# Altium footprint library 全库.PcbLib: 967 footprints (part 5 of 61) (continued)
## Antenna [mm] (continued)
14.4,5.131 ; 11.7,5.133 12.2,5.133 ; 11.7,5.157 14.4,5.157 ; 11.7,5.158 12.2,5.158 ; 11.7,5.182 14.4,5.182 ; 11.7,5.184 12.2,5.184 ; 11.7,5.207 14.4,5.207 ; 11.7,5.209 12.2,5.209 ; 11.7,5.233 14.4,5.233 ; 11.7,5.234 12.2,5.234 ; 11.7,5.258 14.4,5.258 ; 11.7,5.26 12.2,5.26 ; 11.7,5.284 14.4,5.284 ; 11.7,5.285 12.2,5.285 ; 11.7,5.309 14.4,5.309 ; 11.7,5.311 12.2,5.311 ; 11.7,5.334 14.4,5.334 ; 11.7,5.336 12.2,5.336 ; 11.7,5.36 14.4,5.36 ; 11.7,5.361 12.2,5.361 ; 11.7,5.385 14.4,5.385 ; 11.7,5.387 12.2,5.387 ; 13.9,0.963 14.4,0.963 ; 13.9,0.988 14.4,0.988 ; 13.9,1.013 14.4,1.013 ; 13.9,1.039 14.4,1.039 ; 13.9,1.064 14.4,1.064 ; 13.9,1.09 14.4,1.09 ; 13.9,1.115 14.4,1.115 ; 13.9,1.14 14.4,1.14 ; 13.9,1.166 14.4,1.166 ; 13.9,1.191 14.4,1.191 ; 13.9,1.217 14.4,1.217 ; 13.9,1.242 14.4,1.242 ; 13.9,1.267 14.4,1.267 ; 13.9,1.293 14.4,1.293 ; 13.9,1.318 14.4,1.318 ; 13.9,1.344 14.4,1.344 ; 13.9,1.369 14.4,1.369 ; 13.9,1.394 14.4,1.394 ; 13.9,1.42 14.4,1.42 ; 13.9,1.445 14.4,1.445 ; 13.9,1.471 14.4,1.471 ; 13.9,1.496 14.4,1.496 ; 13.9,1.521 14.4,1.521 ; 13.9,1.547 14.4,1.547 ; 13.9,1.572 14.4,1.572 ; 13.9,1.598 14.4,1.598 ; 13.9,1.623 14.4,1.623 ; 13.9,1.648 14.4,1.648 ; 13.9,1.674 14.4,1.674 ; 13.9,1.699 14.4,1.699 ; 13.9,1.725 14.4,1.725 ; 13.9,1.75 14.4,1.75 ; 13.9,1.775 14.4,1.775 ; 13.9,1.801 14.4,1.801 ; 13.9,1.826 14.4,1.826 ; 13.9,1.852 14.4,1.852 ; 13.9,1.877 14.4,1.877 ; 13.9,1.902 14.4,1.902 ; 13.9,1.928 14.4,1.928 ; 13.9,1.953 14.4,1.953 ; 13.9,1.979 14.4,1.979 ; 13.9,2.004 14.4,2.004 ; 13.9,2.029 14.4,2.029 ; 13.9,2.055 14.4,2.055 ; 13.9,2.08 14.4,2.08 ; 13.9,2.106 14.4,2.106 ; 13.9,2.131 14.4,2.131 ; 13.9,2.156 14.4,2.156 ; 13.9,2.182 14.4,2.182 ; 13.9,2.207 14.4,2.207 ; 13.9,2.233 14.4,2.233 ; 13.9,2.258 14.4,2.258 ; 13.9,2.283 14.4,2.283 ; 13.9,2.309 14.4,2.309 ; 13.9,2.334 14.4,2.334 ; 13.9,2.36 14.4,2.36 ; 13.9,2.385 14.4,2.385 ; 13.9,2.41 14.4,2.41 ; 13.9,2.436 14.4,2.436 ; 13.9,2.461 14.4,2.461 ; 13.9,2.487 14.4,2.487 ; 13.9,2.512 14.4,2.512 ; 13.9,2.537 14.4,2.537 ; 13.9,2.563 14.4,2.563 ; 13.9,2.588 14.4,2.588 ; 13.9,2.614 14.4,2.614 ; 13.9,2.639 14.4,2.639 ; 13.9,2.664 14.4,2.664 ; 13.9,2.69 14.4,2.69 ; 13.9,2.715 14.4,2.715 ; 13.9,2.741 14.4,2.741 ; 13.9,2.766 14.4,2.766 ; 13.9,2.791 14.4,2.791 ; 13.9,2.817 14.4,2.817 ; 13.9,2.842 14.4,2.842 ; 13.9,2.868 14.4,2.868 ; 13.9,2.893 14.4,2.893 ; 13.9,2.918 14.4,2.918 ; 13.9,2.944 14.4,2.944 ; 13.9,2.969 14.4,2.969 ; 13.9,2.995 14.4,2.995 ; 13.9,3.02 14.4,3.02 ; 13.9,3.045 14.4,3.045 ; 13.9,3.071 14.4,3.071 ; 13.9,3.096 14.4,3.096 ; 13.9,3.122 14.4,3.122 ; 13.9,3.147 14.4,3.147 ; 13.9,3.172 14.4,3.172 ; 13.9,3.198 14.4,3.198 ; 13.9,3.223 14.4,3.223 ; 13.9,3.249 14.4,3.249 ; 13.9,3.274 14.4,3.274 ; 13.9,3.299 14.4,3.299 ; 13.9,3.325 14.4,3.325 ; 13.9,3.35 14.4,3.35 ; 13.9,3.376 14.4,3.376 ; 13.9,3.401 14.4,3.401 ; 13.9,3.426 14.4,3.426 ; 13.9,3.452 14.4,3.452 ; 13.9,3.477 14.4,3.477 ; 13.9,3.503 14.4,3.503 ; 13.9,3.528 14.4,3.528 ; 13.9,3.553 14.4,3.553 ; 13.9,3.579 14.4,3.579 ; 13.9,3.604 14.4,3.604 ; 13.9,3.63 14.4,3.63 ; 13.9,3.655 14.4,3.655 ; 13.9,3.68 14.4,3.68 ; 13.9,3.706 14.4,3.706 ; 13.9,3.731 14.4,3.731 ; 13.9,3.757 14.4,3.757 ; 13.9,3.782 14.4,3.782 ; 13.9,3.807 14.4,3.807 ; 13.9,3.833 14.4,3.833 ; 13.9,3.858 14.4,3.858 ; 13.9,3.884 14.4,3.884 ; 13.9,3.909 14.4,3.909 ; 13.9,3.934 14.4,3.934 ; 13.9,3.96 14.4,3.96 ; 13.9,3.985 14.4,3.985 ; 13.9,4.011 14.4,4.011 ; 13.9,4.036 14.4,4.036 ; 13.9,4.061 14.4,4.061 ; 13.9,4.087 14.4,4.087 ; 13.9,4.112 14.4,4.112 ; 13.9,4.138 14.4,4.138 ; 13.9,4.163 14.4,4.163 ; 13.9,4.188 14.4,4.188 ; 13.9,4.214 14.4,4.214 ; 13.9,4.239 14.4,4.239 ; 13.9,4.265 14.4,4.265 ; 13.9,4.29 14.4,4.29 ; 13.9,4.315 14.4,4.315 ; 13.9,4.341 14.4,4.341 ; 13.9,4.366 14.4,4.366 ; 13.9,4.392 14.4,4.392 ; 13.9,4.417 14.4,4.417 ; 13.9,4.442 14.4,4.442 ; 13.9,4.468 14.4,4.468 ; 13.9,4.493 14.4,4.493 ; 13.9,4.519 14.4,4.519 ; 13.9,4.544 14.4,4.544 ; 13.9,4.569 14.4,4.569 ; 13.9,4.595 14.4,4.595 ; 13.9,4.62 14.4,4.62 ; 13.9,4.646 14.4,4.646 ; 13.9,4.671 14.4,4.671 ; 13.9,4.696 14.4,4.696 ; 13.9,4.722 14.4,4.722 ; 13.9,4.747 14.4,4.747 ; 13.9,4.773 14.4,4.773 ; 13.9,4.798 14.4,4.798 ; 13.9,4.823 14.4,4.823 ; 13.9,4.849 14.4,4.849 ; 13.9,4.874 14.4,4.874 ; 13.9,4.9 14.4,4.9 ; 13.9,4.925 14.4,4.925 ; 13.9,4.95 14.4,4.95 ; 13.9,4.976 14.4,4.976 ; 13.9,5.001 14.4,5.001 ; 13.9,5.027 14.4,5.027 ; 13.9,5.052 14.4,5.052 ; 13.9,5.077 14.4,5.077 ; 13.9,5.103 14.4,5.103 ; 13.9,5.128 14.4,5.128 ; 13.9,5.154 14.4,5.154 ; 13.9,5.179 14.4,5.179 ; 13.9,5.204 14.4,5.204 ; 13.9,5.23 14.4,5.23 ; 13.9,5.255 14.4,5.255 ; 13.9,5.281 14.4,5.281 ; 13.9,5.306 14.4,5.306 ; 13.9,5.331 14.4,5.331 ; 13.9,5.357 14.4,5.357 ; 13.9,5.382 14.4,5.382 ; 0,4.89 0,5.39 ; 0,4.89 5,4.89 5,5.39 ; 0,5.39 0,0 0.9,0 0.9,5.39 0,5.39 ; 0,5.39 5,5.39 ; 4.5,2.25 4.5,2.75 7.5,2.75 7.5,2.25 ; 4.5,2.25 7.5,2.25 ; 4.5,2.25 4.5,5.39 5,5.39 ; 4.5,2.25 5,2.25 5,5.39 ; 7,5.39 7,4.89 9.7,4.89 9.7,5.39 ; 7,5.39 9.7,5.39 ; 7,5.39 7.5,5.39 7.5,2.25 ; 7,5.39 7,2.25 7.5,2.25 ; 9.2,2.25 9.7,2.25 9.7,5.39 ; 9.2,2.25 9.2,5.39 9.7,5.39 ; 9.2,2.25 9.2,2.75 12.2,2.75 12.2,2.25 ; 9.2,2.25 12.2,2.25 ; 11.7,5.39 12.2,5.39 12.2,2.25 ; 11.7,5.39 11.7,2.25 12.2,2.25 ; 11.7,5.39 11.7,4.89 14.4,4.89 14.4,5.39 ; 11.7,5.39 14.4,5.39 ; 14.4,5.39 14.4,0.95 13.9,0.95 13.9,5.39 14.4,5.39 ; 2.3,0 2.3,5.39 2.8,5.39 2.8,0 2.3,0
Keep-Out Layer:
  lines w0.01: -0.5,0.5 0,0.5 ; 5.3,5.69 14.7,5.69
Mechanical 1:
  lines w0.01: -0.5,0.5 -0.5,5.69 14.7,5.69 14.7,0.5 -0.5,0.5

## BGA-14 [mm]
pads (14):
  round 0.3 smd mask+0.051: A1(-0.75,-0.75) A2(-0.75,-0.25) A3(-0.75,0.25) A4(-0.75,0.75) B1(-0.25,-0.75) B3(-0.25,0.25) B4(-0.25,0.75) C1(0.25,-0.75) C2(0.25,-0.25) C3(0.25,0.25) C4(0.25,0.75) D1(0.75,-0.75) D2(0.75,-0.25) D4(0.75,0.75)
Top Overlay:
  circle w0.25: c-1.05,-1.7 r0.12
  lines w0.2: -1.175,-0.975 -0.975,-1.2 ; -1.2,-1.2 -1.2,1.2 1.2,1.2 1.2,-1.2 -1.2,-1.2
Mechanical 13:
  lines w0.1: -1,-1 -1,1 1,1 1,-1 -1,-1

## BGA-84_7.5x12.5mm [mm]
pads (84):
  round 0.41 smd mask+0.051: A1(-5.6,-3.2) A2(-5.6,-2.4) A3(-5.6,-1.6) A7(-5.6,1.6) A8(-5.6,2.4) A9(-5.6,3.2) B1(-4.8,-3.2) B2(-4.8,-2.4) B3(-4.8,-1.6) B7(-4.8,1.6) B8(-4.8,2.4) B9(-4.8,3.2) C1(-4,-3.2) C2(-4,-2.4) C3(-4,-1.6) C7(-4,1.6) C8(-4,2.4) C9(-4,3.2) D1(-3.2,-3.2) D2(-3.2,-2.4) D3(-3.2,-1.6) D7(-3.2,1.6) D8(-3.2,2.4) D9(-3.2,3.2) E1(-2.4,-3.2) E2(-2.4,-2.4) E3(-2.4,-1.6) E7(-2.4,1.6) E8(-2.4,2.4) E9(-2.4,3.2) F1(-1.6,-3.2) F2(-1.6,-2.4) F3(-1.6,-1.6) F7(-1.6,1.6) F8(-1.6,2.4) F9(-1.6,3.2) G1(-0.8,-3.2) G2(-0.8,-2.4) G3(-0.8,-1.6) G7(-0.8,1.6) G8(-0.8,2.4) G9(-0.8,3.2) H1(0,-3.2) H2(0,-2.4) H3(0,-1.6) H7(0,1.6) H8(0,2.4) H9(0,3.2) J1(0.8,-3.2) J2(0.8,-2.4) J3(0.8,-1.6) J7(0.8,1.6) J8(0.8,2.4) J9(0.8,3.2) K2(1.6,-2.4) K3(1.6,-1.6) K7(1.6,1.6) K8(1.6,2.4) K9(1.6,3.2) L1(2.4,-3.2) L2(2.4,-2.4) L3(2.4,-1.6) L7(2.4,1.6) L8(2.4,2.4) M2(3.2,-2.4) M3(3.2,-1.6) M7(3.2,1.6) M8(3.2,2.4) M9(3.2,3.2) N1(4,-3.2) N2(4,-2.4) N3(4,-1.6) N7(4,1.6) N8(4,2.4) P2(4.8,-2.4) P3(4.8,-1.6) P7(4.8,1.6) P8(4.8,2.4) P9(4.8,3.2) R1(5.6,-3.2) R2(5.6,-2.4) R3(5.6,-1.6) R7(5.6,1.6) R8(5.6,2.4)
Top Overlay:
  circle w0.4: c-5.9,-4.5 r0.2
  region: -6.197,-3.697 -5.7,-3.697 -5.999,-3.399 -6.197,-3.2
  lines w0.2: -6.2,-3.7 6.2,-3.7 6.2,3.7 -6.2,3.7 -6.2,-3.7
Mechanical 13:
  lines w0.1: -6.3,-3.8 -6.3,3.8 6.3,3.8 6.3,-3.8 -6.3,-3.8

## BGA-121 [mm]
pads (121):
  round 0.4 smd mask+0.051: A1(-4,-4) A2(-4,-3.2) A3(-4,-2.4) A4(-4,-1.6) A5(-4,-0.8) A6(-4,0) A7(-4,0.8) A8(-4,1.6) A9(-4,2.4) A10(-4,3.2) A11(-4,4) B1(-3.2,-4) B2(-3.2,-3.2) B3(-3.2,-2.4) B4(-3.2,-1.6) B5(-3.2,-0.8) B6(-3.2,0) B7(-3.2,0.8) B8(-3.2,1.6) B9(-3.2,2.4) B10(-3.2,3.2) B11(-3.2,4) C1(-2.4,-4) C2(-2.4,-3.2) C3(-2.4,-2.4) C4(-2.4,-1.6) C5(-2.4,-0.8) C6(-2.4,0) C7(-2.4,0.8) C8(-2.4,1.6) C9(-2.4,2.4) C10(-2.4,3.2) C11(-2.4,4) D1(-1.6,-4) D2(-1.6,-3.2) D3(-1.6,-2.4) D4(-1.6,-1.6) D5(-1.6,-0.8) D6(-1.6,0) D7(-1.6,0.8) D8(-1.6,1.6) D9(-1.6,2.4) D10(-1.6,3.2) D11(-1.6,4) E1(-0.8,-4) E2(-0.8,-3.2) E3(-0.8,-2.4) E4(-0.8,-1.6) E5(-0.8,-0.8) E6(-0.8,0) E7(-0.8,0.8) E8(-0.8,1.6) E9(-0.8,2.4) E10(-0.8,3.2) E11(-0.8,4) F1(0,-4) F2(0,-3.2) F3(0,-2.4) F4(0,-1.6) F5(0,-0.8) F6(0,0) F7(0,0.8) F8(0,1.6) F9(0,2.4) F10(0,3.2) F11(0,4) G1(0.8,-4) G2(0.8,-3.2) G3(0.8,-2.4) G4(0.8,-1.6) G5(0.8,-0.8) G6(0.8,0) G7(0.8,0.8) G8(0.8,1.6) G9(0.8,2.4) G10(0.8,3.2) G11(0.8,4) H1(1.6,-4) H2(1.6,-3.2) H3(1.6,-2.4) H4(1.6,-1.6) H5(1.6,-0.8) H6(1.6,0) H7(1.6,0.8) H8(1.6,1.6) H9(1.6,2.4) H10(1.6,3.2) H11(1.6,4) J1(2.4,-4) J2(2.4,-3.2) J3(2.4,-2.4) J4(2.4,-1.6) J5(2.4,-0.8) J6(2.4,0) J7(2.4,0.8) J8(2.4,1.6) J9(2.4,2.4) J10(2.4,3.2) J11(2.4,4) K1(3.2,-4) K2(3.2,-3.2) K3(3.2,-2.4) K4(3.2,-1.6) K5(3.2,-0.8) K6(3.2,0) K7(3.2,0.8) K8(3.2,1.6) K9(3.2,2.4) K10(3.2,3.2) K11(3.2,4) L1(4,-4) L2(4,-3.2) L3(4,-2.4) L4(4,-1.6) L5(4,-0.8) L6(4,0) L7(4,0.8) L8(4,1.6) L9(4,2.4) L10(4,3.2) L11(4,4)
Top Overlay:
  circle w0.4: c-4.6,-5.7 r0.2
  region: -4.868,-4.863 -3.937,-4.863 -4.863,-3.937 -4.868,-3.937
  lines w0.254: -4.9,-4.9 4.9,-4.9 4.9,4.9 -4.9,4.9 -4.9,-4.9
Mechanical 13:
  lines w0.1: -5,-5 -5,5 5,5 5,-5 -5,-5

## BGA-143 [mm]
pads (143):
  round 0.3 smd mask+0.051: A1(-2.75,-2.75) A2(-2.75,-2.25) A3(-2.75,-1.75) A4(-2.75,-1.25) A5(-2.75,-0.75) A6(-2.75,-0.25) A7(-2.75,0.25) A8(-2.75,0.75) A9(-2.75,1.25) A10(-2.75,1.75) A11(-2.75,2.25) A12(-2.75,2.75) B1(-2.25,-2.75) B2(-2.25,-2.25) B3(-2.25,-1.75) B4(-2.25,-1.25) B5(-2.25,-0.75) B6(-2.25,-0.25) B7(-2.25,0.25) B8(-2.25,0.75) B9(-2.25,1.25) B10(-2.25,1.75) B11(-2.25,2.25) B12(-2.25,2.75) C1(-1.75,-2.75) C2(-1.75,-2.25) C3(-1.75,-1.75) C4(-1.75,-1.25) C5(-1.75,-0.75) C6(-1.75,-0.25) C7(-1.75,0.25) C8(-1.75,0.75) C9(-1.75,1.25) C10(-1.75,1.75) C11(-1.75,2.25) C12(-1.75,2.75) D1(-1.25,-2.75) D2(-1.25,-2.25) D3(-1.25,-1.75) D4(-1.25,-1.25) D5(-1.25,-0.75) D6(-1.25,-0.25) D7(-1.25,0.25) D8(-1.25,0.75) D9(-1.25,1.25) D10(-1.25,1.75) D11(-1.25,2.25) D12(-1.25,2.75) E1(-0.75,-2.75) E2(-0.75,-2.25) E3(-0.75,-1.75) E4(-0.75,-1.25) E5(-0.75,-0.75) E6(-0.75,-0.25) E7(-0.75,0.25) E8(-0.75,0.75) E9(-0.75,1.25) E10(-0.75,1.75) E11(-0.75,2.25) E12(-0.75,2.75) F1(-0.25,-2.75) F2(-0.25,-2.25) F3(-0.25,-1.75) F4(-0.25,-1.25) F5(-0.25,-0.75) F7(-0.25,0.25) F8(-0.25,0.75) F9(-0.25,1.25) F10(-0.25,1.75) F11(-0.25,2.25) F12(-0.25,2.75) G1(0.25,-2.75) G2(0.25,-2.25) G3(0.25,-1.75) G4(0.25,-1.25) G5(0.25,-0.75) G6(0.25,-0.25) G7(0.25,0.25) G8(0.25,0.75) G9(0.25,1.25) G10(0.25,1.75) G11(0.25,2.25) G12(0.25,2.75) H1(0.75,-2.75) H2(0.75,-2.25) H3(0.75,-1.75) H4(0.75,-1.25) H5(0.75,-0.75) H6(0.75,-0.25) H7(0.75,0.25) H8(0.75,0.75) H9(0.75,1.25) H10(0.75,1.75) H11(0.75,2.25) H12(0.75,2.75) J1(1.25,-2.75) J2(1.25,-2.25) J3(1.25,-1.75) J4(1.25,-1.25) J5(1.25,-0.75) J6(1.25,-0.25) J7(1.25,0.25) J8(1.25,0.75) J9(1.25,1.25) J10(1.25,1.75) J11(1.25,2.25) J12(1.25,2.75) K1(1.75,-2.75) K2(1.75,-2.25) K3(1.75,-1.75) K4(1.75,-1.25) K5(1.75,-0.75) K6(1.75,-0.25) K7(1.75,0.25) K8(1.75,0.75) K9(1.75,1.25) K10(1.75,1.75) K11(1.75,2.25) K12(1.75,2.75) L1(2.25,-2.75) L2(2.25,-2.25) L3(2.25,-1.75) L4(2.25,-1.25) L5(2.25,-0.75) L6(2.25,-0.25) L7(2.25,0.25) L8(2.25,0.75) L9(2.25,1.25) L10(2.25,1.75) L11(2.25,2.25) L12(2.25,2.75) M1(2.75,-2.75) M2(2.75,-2.25) M3(2.75,-1.75) M4(2.75,-1.25) M5(2.75,-0.75) M6(2.75,-0.25) M7(2.75,0.25) M8(2.75,0.75) M9(2.75,1.25) M10(2.75,1.75) M11(2.75,2.25) M12(2.75,2.75)
Top Overlay:
  circle w0.3: c-3.2,-4 r0.15
  region: -3.45,-3.45 -2.55,-3.45 -2.75,-3.25 -3.45,-2.55
  lines w0.2: -3.4,-3.4 3.4,-3.4 3.4,3.4 -3.4,3.4 -3.4,-3.4
Mechanical 13:
  lines w0.1: -3.5,-3.5 -3.5,3.5 3.5,3.5 3.5,-3.5 -3.5,-3.5

## BNC_COAXIAL [mm] "Connector; BNC Elbow"
pads (4):
  rect 1.5x1.5 hole 0.9: 1(0,0)
  round 3.3 hole 2: 2(-5.1,-5.1) 2(5.1,-5.1)
  round 1.5 hole 0.9: 2(2.5,0)
Top Overlay:
  circle w0.025: c0,-28.9 r1
  lines w0.025: -6.25,-20.1 6.25,-19.1 ; -6.25,-19.1 6.25,-18.1 ; -6.25,-18.1 6.25,-17.1 ; -6.25,-17.1 6.25,-16.1 ; -6.25,-16.1 6.25,-15.1 ; -6.25,-15.1 6.25,-14.1 ; -6.25,-14.1 6.25,-13.1 ; 6.25,-20.1 -6.25,-21.1 ; -6.25,-21.1 -6.25,-12.2 ; -6.25,-21.1 -4.8,-21.1 ; -6.25,-12.2 -7.4,-12.2 -7.4,1.9 7.4,1.9 7.4,-12.2 6.25,-12.2 ; -6.25,-12.2 6.25,-12.2 ; -4.8,-21.1 -4.8,-33 4.8,-33 4.8,-21.1 ; -4.8,-21.1 4.8,-21.1 ; 4.8,-21.1 6.25,-21.1 6.25,-12.2 ; -5.9,-11 5.9,-11 5.9,-3 -5.9,-3 -5.9,-11
  lines w0.2: -6.25,-12.2 -6.25,-21.1 -4.8,-21.1 ; -6.25,-12.2 -7.4,-12.2 -7.4,1.9 7.4,1.9 7.4,-12.2 6.25,-12.2 ; -6.25,-12.2 6.25,-12.2 ; -4.8,-21.1 -4.8,-33 4.8,-33 4.8,-21.1 ; -4.8,-21.1 4.8,-21.1 ; 4.8,-21.1 6.25,-21.1 6.25,-12.2

## BNC_COAXIAL_D [mm] "Connector; BNC Elbow"
pads (6):
  round 3.3 hole 2.2: 0(-5,-10) 0(5,-10)
  rect 1.5x1.5 hole 0.9: 1(0,-2.54)
  round 1.5 hole 0.9: 2(-2.54,0) 3(0,0) 4(2.5,0)
Top Overlay:
  circle w0.2: c0.016,-31.75 r1
  lines w0.025: -7.4,-15.24 -7.4,1.27 ; -6.25,-23.756 6.461,-22.739 ; -6.25,-20.1 6.25,-19.1 ; -6.25,-19.1 6.25,-18.1 ; -6.25,-18.1 6.25,-17.1 ; -6.25,-17.1 6.25,-16.1 ; -6.25,-16.1 2.289,-15.267 ; -6.235,-20.931 6.265,-19.931 ; -6.108,-22.709 6.392,-21.709 ; -6.108,-21.693 6.392,-20.693 ; 6.25,-21.1 6.25,-15.24 ; 7.4,-15.24 7.4,1.27 ; -5.9,-13.335 -5.9,-1.27 5.9,-1.27 5.9,-13.335 -5.9,-13.335
  lines w0.2: -6.25,-23.74 -6.25,-15.24 ; -6.223,-23.74 -4.8,-23.74 ; 4.8,-23.749 4.8,-35.687 -4.8,-35.687 -4.8,-23.74 ; -6.25,-15.24 6.25,-15.24 ; -6.25,-15.24 -7.4,-15.24 -7.4,1.27 7.4,1.27 7.4,-15.24 6.25,-15.24 ; -4.8,-23.74 4.8,-23.74 6.25,-23.74 6.25,-15.24

## BP_TM_L4.7_D9 [mm]
pads (2):
  rect 1.5x1.5 hole 0.8: 1(0,0)
  round 1.5 hole 0.8: 2(4.7,0)
Top Overlay:
  circle w0.254: c2.35,0 r4.5
  text "+" at -3.683,-0.762 h1.52

## BP_TM_L5.08_D9 [mil]
pads (2):
  rect 60x60 hole 30: 1(0,0)
  round 60 hole 30: 2(200,0)
Top Overlay:
  circle w10: c102.87,0.04 r177.17
  text "+" at -145,-30 h59.84

## BP_TM_L7.62_D12 [mm]
pads (2):
  rect 1.8x1.8 hole 0.8: 1(0,0)
  round 1.8 hole 0.8: 2(7.62,0)
Top Overlay:
  circle w0.254: c3.826,0 r6
  text "+" at -3.683,-0.762 h1.52

## BR-3 [mm]
pads (4):
  round 2.5 hole 1.3: 1(-5.4,-5.4) 2(-5.4,5.4) 3(5.4,5.4) 4(5.4,-5.4)
Top Overlay:
  circle w0.254: c0,0 r2
  lines w0.254: -8.9,7.9 -6.9,7.9 ; -7.9,6.9 -7.9,8.9 ; -6.5,-3.2 cw(c-6,-3.2) -5.5,-3.2 ccw(c-5,-3.2) -4.5,-3.2 ; -3.6,5.5 -1.6,5.5 ; -2.6,4.5 -2.6,6.5 ; 1.6,-5.4 3.6,-5.4 ; 4.5,3.2 cw(c5,3.2) 5.5,3.2 ccw(c6,3.2) 6.5,3.2 ; -7.8,-7.8 -7.8,6 -6,7.8 7.8,7.8 7.8,-7.8 -7.8,-7.8
Mechanical 13:
  lines w0.1: -7.9,-7.9 -7.9,7.9 7.9,7.9 7.9,-7.9 -7.9,-7.9